# Altium footprint library ECE453.PcbLib: 68 footprints (part 3 of 5)
Each footprint in its own frame and in the unit in brackets; x right, y up, seen from the top. Pads: shape width x height; smd on the part's side, far side on the other; paste and mask are expansions set on the pad; w line width, h text height; cw(c..) or ccw(c..) is an arc to the next point about the centre after c.
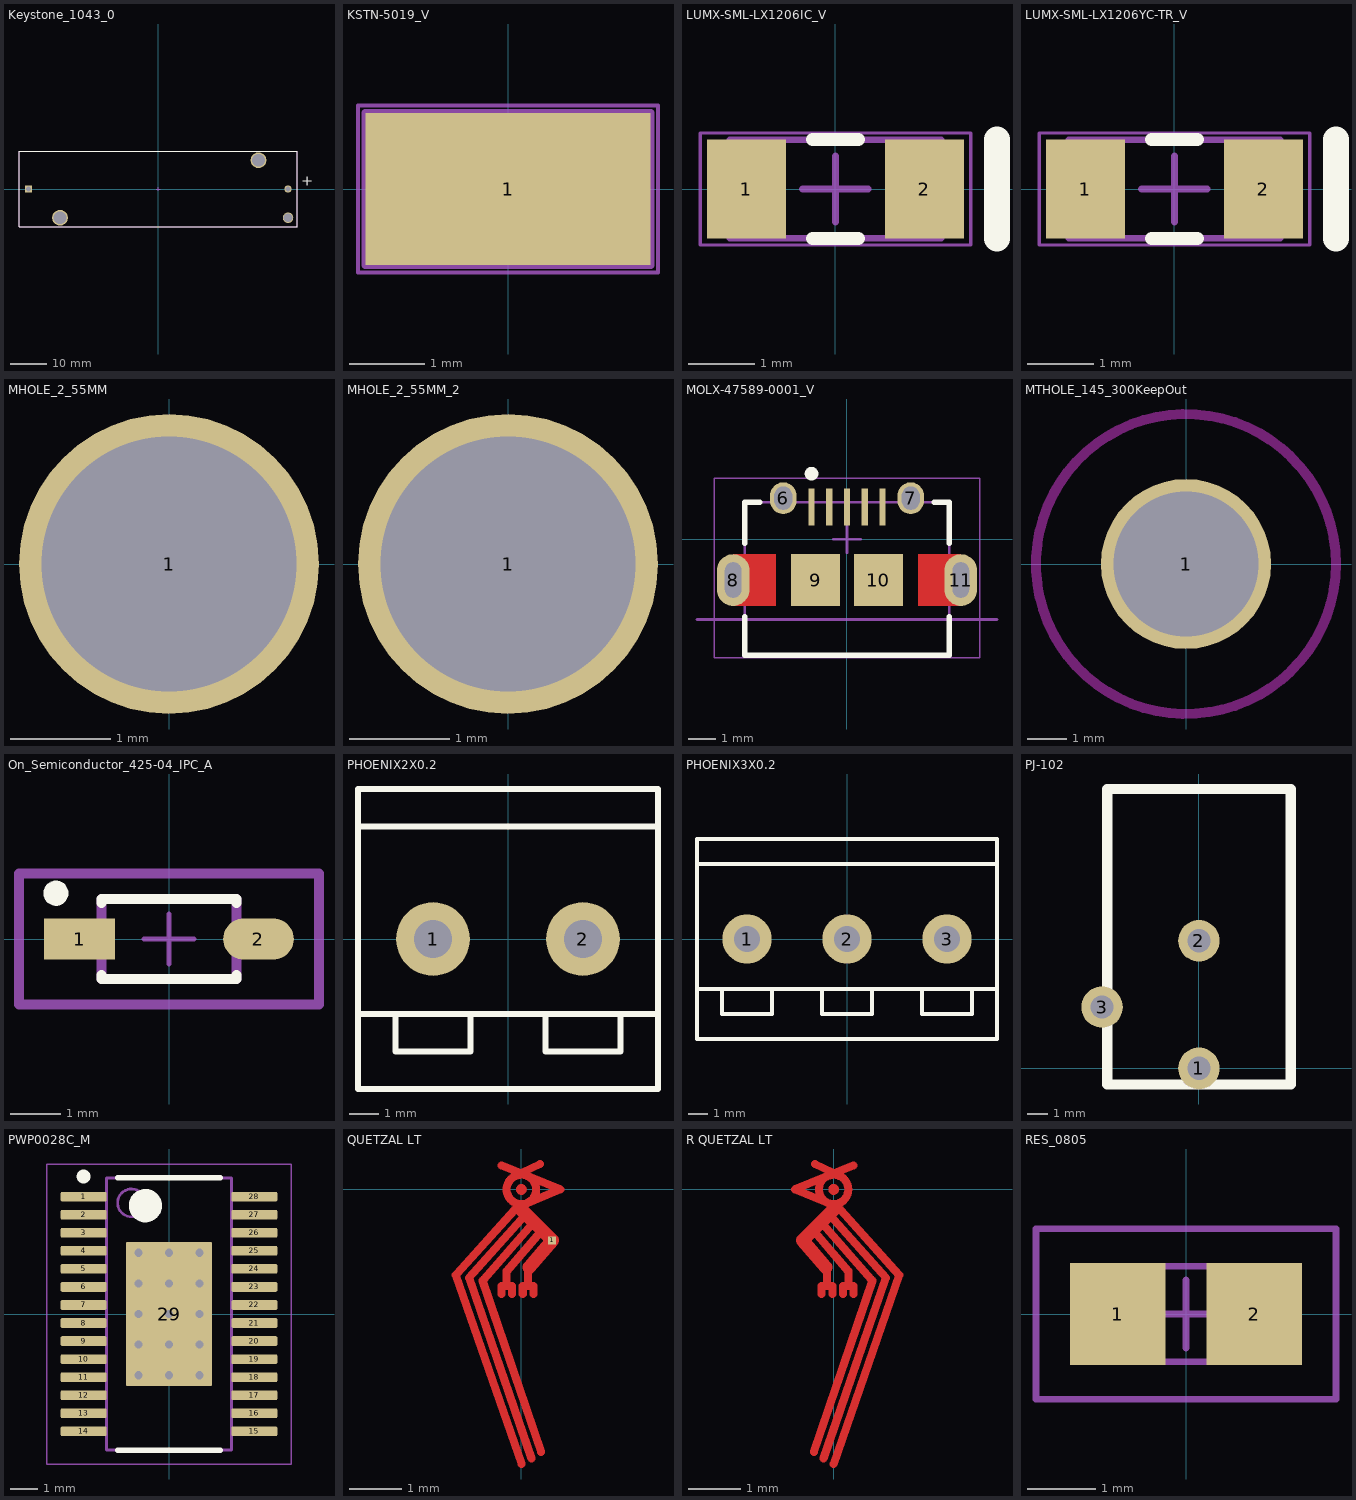
[diagram p2: the footprints below, top view; thin cyan lines are the x and y axes]

## Keystone_1043_0 [mil]
pads (5):
  rect 79.53x79.53 hole 52 paste-39370.1 mask+0: 1(-1422.5,0)
  round 79.53 hole 52 paste-39370.1 mask+0: 2(1422.5,0)
  round 175 hole 140 unplated paste-39370.1 mask+0: ""(-1076.5,-315) ""(1098.5,315)
  round 115 hole 94 unplated paste-39370.1 mask+0: ""(1422.5,-315)
Top Overlay:
  lines w7.87: -1522,-411.5 -1522,411.5 1522,411.5 1522,-411.5 -1522,-411.5
  text "+" at 1564.96,0 h196.85
Mechanical 10:
  lines w7.87: -1525.94,-415.44 -1525.94,415.44 1525.94,415.44 1525.94,-415.44 -1525.94,-415.44
  text ".Designator" at 0,0 h39.37
Mechanical 12:
  lines w5.91: -1522,-411.5 -1522,411.5 1522,411.5 1522,-411.5 -1522,-411.5
Mechanical 15:
  lines w3.94: -19.68,0 19.68,0 ; 0,-19.68 0,19.68
  lines w7.87: -1525.94,-415.44 -1525.94,415.44 1525.94,415.44 1525.94,-415.44 -1525.94,-415.44
3D body "Batt_Keystone_1043_eec.STEP": height 10, standoff 0, extent -1525.94,-415.44 1525.94,415.44

## KSTN-5019_V [mm]
pads (1):
  rect 3.8x2.03 smd: 1(0,0)
Mechanical 13:
  lines w0.1: -1.905,-1.015 1.905,-1.015 1.905,1.015 -1.905,1.015 -1.905,-1.015
Mechanical 15:
  lines w0.05: -2,-1.115 -2,1.115 2,1.115 2,-1.115 -2,-1.115
  lines w0.1: -0.5,0 0.5,0 ; 0,-0.5 0,0.5
3D body "keystone-PN5019.STEP": height 2.29, standoff 0, extent -1.905,-1.015 1.905,1.017

## LUMX-SML-LX1206IC_V [mm]
pads (2):
  rect 1.2x1.5 smd: 1(-1.35,0) 2(1.35,0)
Top Overlay:
  lines w0.2: -0.35,-0.75 0.35,-0.75 ; -0.35,0.75 0.35,0.75
  lines w0.4: 2.45,-0.75 2.45,0.75
Mechanical 13:
  lines w0.1: -1.6,-0.75 1.6,-0.75 1.6,0.75 -1.6,0.75 -1.6,-0.75
Mechanical 15:
  lines w0.05: -2.05,-0.85 2.05,-0.85 2.05,0.85 -2.05,0.85 -2.05,-0.85
  lines w0.1: -0.5,0 0.5,0 ; 0,-0.5 0,0.5
3D body: height 1.1, standoff 0, extent -1.6,-0.8 1.6,0.8

## LUMX-SML-LX1206YC-TR_V [mm]
pads (2):
  rect 1.2x1.5 smd: 1(-1.35,0) 2(1.35,0)
Top Overlay:
  lines w0.2: -0.35,-0.75 0.35,-0.75 ; -0.35,0.75 0.35,0.75
  lines w0.4: 2.45,-0.75 2.45,0.75
Mechanical 13:
  lines w0.1: -1.6,-0.75 -1.6,0.75 1.6,0.75 1.6,-0.75 -1.6,-0.75
Mechanical 15:
  lines w0.05: -2.05,-0.85 2.05,-0.85 2.05,0.85 -2.05,0.85 -2.05,-0.85
  lines w0.1: -0.5,0 0.5,0 ; 0,-0.5 0,0.5
3D body: height 1.25, standoff 0, extent -1.6,-0.75 1.6,0.75

## MHOLE_2_55MM [mm]
pads (1):
  round 3 / inner round 4.572 / far side round 4.318 hole 2.55: 1(0,0)

## MHOLE_2_55MM_2 [mm]
pads (1):
  round 3 / inner round 4.572 / far side round 4.318 hole 2.55: 1(0,0)

## MOLX-47589-0001_V [mm]
pads (11):
  rect 0.222x1.35 smd: 1(-1.3,1.175) 2(-0.65,1.175) 3(0,1.175) 4(0.65,1.175) 5(1.3,1.175)
  oval 0.965x1.168 hole 0.65 slot 0.85 at 90 deg: 6(-2.337,1.5) 7(2.337,1.5)
  oval 1.2x1.9 hole 0.6 slot 1.3 at 90 deg: 8(-4.175,-1.5) 11(4.175,-1.5)
  rect 1.8x1.9 smd: 9(-1.15,-1.5) 10(1.15,-1.5)
Top Layer:
  rectangle: 2.6,-2.45 4.175,-0.55
  region: -2.6,-0.55 -4.175,-0.55 -4.175,-2.45 -2.6,-2.45
Top Overlay:
  circle w0.25: c-1.3,2.4 r0.125
  lines w0.2: -3.75,-2.85 -3.75,-4.25 3.75,-4.25 3.75,-2.85 ; -3.75,-0.15 -3.75,1.35 -3.2,1.35 ; 3.2,1.35 3.75,1.35 3.75,-0.15
Mechanical 1:
  lines w0.1: -5.5,-2.95 5.5,-2.95
  text "PCB EDGE" at 5.7,-2.5 h0.89
Mechanical 13:
  lines w0.1: -3.75,-4.25 3.75,-4.25 3.75,1.35 -3.75,1.35 -3.75,-4.25
Mechanical 15:
  lines w0.05: -4.875,-4.35 -4.875,2.225 4.875,2.225 4.875,-4.35 -4.875,-4.35
  lines w0.1: -0.5,0 0.5,0 ; 0,-0.5 0,0.5
3D body "475890001.stp": height 2.74, standoff -0.57, extent -4.325,-4.25 4.325,1.644

## MTHOLE_145_300KeepOut [mil]
pads (1):
  round 170 / inner round 180 / far side round 170 hole 145: 1(0,0)
Keep-Out Layer:
  circle w10: c0,0 r150

## On_Semiconductor_425-04_IPC_A [mm]
pads (2):
  rect 1.408x0.822 smd paste+0 mask+0: 1(-1.78,0)
  rrect100% 1.408x0.822 smd paste+0 mask+0: 2(1.78,0)
Top Overlay:
  circle w0.25: c-2.249,0.911 r0.125
  lines w0.2: -1.345,-0.72 -1.345,-0.8 1.345,-0.8 1.345,-0.72 ; -1.345,0.72 -1.345,0.8 1.345,0.8 1.345,0.72
Mechanical 10:
  lines w0.2: -2.984,-1.3 -2.984,1.3 2.984,1.3 2.984,-1.3 -2.984,-1.3
Mechanical 12:
  lines w0.2: -1.345,-0.8 -1.345,0.8 1.345,0.8 1.345,-0.8 -1.345,-0.8
Mechanical 15:
  lines w0.1: -0.5,0 0.5,0 ; 0,-0.5 0,0.5
  lines w0.2: -2.984,-1.3 -2.984,1.3 2.984,1.3 2.984,-1.3 -2.984,-1.3
3D body "Diode_On_Semiconductor_MBR0540T1G_eec.STEP": height 0.25, standoff 0, extent -2.984,-1.3 2.984,1.3

## PHOENIX2X0.2 [mm]
pads (2):
  round 2.5 hole 1.295: 1(-2.54,0) 2(2.54,0)
Top Overlay:
  lines w0.203: -5.08,-2.54 5.08,-2.54 ; -5.08,3.81 5.08,3.81 ; -3.81,-2.54 -3.81,-3.81 -1.27,-3.81 -1.27,-2.54 ; 1.27,-2.54 1.27,-3.81 3.81,-3.81 3.81,-2.54 ; 5.08,-2.54 5.08,5.08 -5.08,5.08 -5.08,-5.08 5.08,-5.08 5.08,-2.54
3D body "CUI_DEVICES_TB010-508-P02GR.step": height 18.05, standoff -3.65, extent -5.48,-5.585 5.48,5.715

## PHOENIX3X0.2 [mm]
pads (3):
  round 2.5 hole 1.3: 1(-5.08,0) 2(0,0) 3(5.08,0)
Top Overlay:
  lines w0.203: -7.62,-2.54 7.62,-2.54 ; -7.62,3.81 7.62,3.81 ; -6.35,-2.54 -6.35,-3.81 -3.81,-3.81 -3.81,-2.54 ; -1.27,-2.54 -1.27,-3.81 1.27,-3.81 1.27,-2.54 ; 3.81,-2.54 3.81,-3.81 6.35,-3.81 6.35,-2.54 ; -7.62,-5.08 -7.62,5.08 7.62,5.08 7.62,-1.905 7.62,-5.08 -7.62,-5.08
3D body "CUI_DEVICES_TB010-508-P03GR.step": height 18.05, standoff -3.65, extent -7.995,-5.639 8.045,5.661

## PJ-102 [mil]
pads (3):
  round 80 hole 45: 1(0,0) 2(0,246.05) 3(-187,118.1)
Top Overlay:
  lines w19.68: -177,-31.5 177,-31.5 177,538.87 -177,538.87 -177,-31.5
3D body "pj-102ah.stp": height 435.17, standoff -135.7, extent -190.04,-20 180.04,546.92

## PWP0028C_M [mm]
pads (29):
  rrect29% 1.65x0.35 smd: 1(-3.075,4.225) 2(-3.075,3.575) 3(-3.075,2.925) 4(-3.075,2.275) 5(-3.075,1.625) 6(-3.075,0.975) 7(-3.075,0.325) 8(-3.075,-0.325) 9(-3.075,-0.975) 10(-3.075,-1.625) 11(-3.075,-2.275) 12(-3.075,-2.925) 13(-3.075,-3.575) 14(-3.075,-4.225) 15(3.075,-4.225) 16(3.075,-3.575) 17(3.075,-2.925) 18(3.075,-2.275) 19(3.075,-1.625) 20(3.075,-0.975) 21(3.075,-0.325) 22(3.075,0.325) 23(3.075,0.975) 24(3.075,1.625) 25(3.075,2.275) 26(3.075,2.925) 27(3.075,3.575) 28(3.075,4.225)
  rrect3% 3.1x5.18 smd: 29(0,0)
via -1.1,2.2 diameter 0.6 hole 0.3
via 0,2.2 diameter 0.6 hole 0.3
via 1.1,2.2 diameter 0.6 hole 0.3
via -1.1,1.1 diameter 0.6 hole 0.3
via 0,1.1 diameter 0.6 hole 0.3
via 1.1,1.1 diameter 0.6 hole 0.3
via -1.1,0 diameter 0.6 hole 0.3
via 0,0 diameter 0.6 hole 0.3
via 1.1,0 diameter 0.6 hole 0.3
via -1.1,-1.1 diameter 0.6 hole 0.3
via 0,-1.1 diameter 0.6 hole 0.3
via 1.1,-1.1 diameter 0.6 hole 0.3
via -1.1,-2.2 diameter 0.6 hole 0.3
via 0,-2.2 diameter 0.6 hole 0.3
via 1.1,-2.2 diameter 0.6 hole 0.3
Top Overlay:
  circle w0.25: c-3.075,4.95 r0.125
  circle w0.6: c-0.85,3.9 r0.3
  lines w0.2: -1.85,-4.9 1.85,-4.9 ; -1.85,4.9 1.85,4.9
Mechanical 1:
  text ".Designator" at -1.524,-0.508 h1.02
Mechanical 13:
  circle w0.1: c-1.35,4 r0.5
  lines w0.1: -2.25,-4.9 -2.25,4.9 2.25,4.9 2.25,-4.9 -2.25,-4.9
Mechanical 15:
  lines w0.05: -4.4,-5.4 -4.4,5.4 4.4,5.4 4.4,-5.4 -4.4,-5.4
  lines w0.1: -0.5,0 0.5,0 ; 0,-0.5 0,0.5
3D body: height 1.2, standoff 0.05, extent -2.25,-4.9 2.25,4.9

## QUETZAL LT [mil]
pads (1):
  rect 6x6 smd mask+0: 1(23,-38)
Top Layer:
  circle w4: c0,0 r2
  circle w6: c0,0 r11
  lines w6: -49,-64 0.17,-204.94 ; -48,-63 -5,-15 ; -29,-68 14.74,-196.09 ; -28,-67 8,-26 ; -15,-78 -15,-72 -7,-72 -7,-78 ; -15,18 29,0 0,-12 ; -11,-71 -11,-62 ; -11,-61 14,-32 ; -5,10 14,19 ; 1,-78 1,-72 9,-72 9,-78 ; 3,-19 -39,-66 7.55,-200.84 ; 5,-71 5,-62
  lines w10: 0,-15 23,-38 6,-58
Top Solder:
  circle w6: c0,0 r11
  circle w4: c0,0 r2
  lines w6: -29,-68 14.63,-195.78 ; -28,-67 8,-26 ; -15,-78 -15,-72 -7,-72 -7,-78 ; -15,18 29,0 0,-12 ; -11,-70 -11,-61 14,-32 ; -5,10 14,19 ; -2.83,-12.46 -49,-64 0.17,-204.94 ; 1,-78 1,-72 9,-72 9,-78 ; 3,-19 -39,-66 7.54,-200.81 ; 5,-70 5,-61
  lines w10: 0,-15 23,-38 6,-58

## R QUETZAL LT [mm]
Top Layer:
  circle w0.102: c0,0 r0.051
  circle w0.152: c0,0 r0.279
  lines w0.152: -0.374,-4.981 0.737,-1.727 ; -0.356,-0.813 0.279,-1.549 ; -0.356,0.483 0.127,0.254 ; -0.229,-1.981 -0.229,-1.829 -0.025,-1.829 -0.025,-1.981 ; -0.203,-0.66 0.711,-1.702 ; -0.192,-5.101 0.991,-1.676 -0.076,-0.483 ; -0.127,-1.791 -0.127,-1.562 ; 0,-5.207 1.245,-1.626 0.127,-0.381 ; 0,-0.305 -0.737,0 0.381,0.457 ; 0.178,-1.981 0.178,-1.829 0.381,-1.829 0.381,-1.981 ; 0.279,-1.791 0.279,-1.562
  lines w0.254: -0.152,-1.473 -0.584,-0.965 0,-0.381
Top Solder:
  circle w0.152: c0,0 r0.279
  circle w0.102: c0,0 r0.051
  lines w0.152: -0.372,-4.973 0.737,-1.727 ; -0.356,-0.813 0.279,-1.549 0.279,-1.778 ; -0.356,0.483 0.127,0.254 ; -0.229,-1.981 -0.229,-1.829 -0.025,-1.829 -0.025,-1.981 ; -0.203,-0.66 0.711,-1.702 ; -0.192,-5.101 0.991,-1.676 -0.076,-0.483 ; -0.127,-1.765 -0.127,-1.537 ; 0,-5.207 1.245,-1.626 0.076,-0.33 ; 0,-0.305 -0.737,0 0.381,0.457 ; 0.178,-1.981 0.178,-1.829 0.381,-1.829 0.381,-1.981
  lines w0.254: -0.152,-1.473 -0.584,-0.965 0,-0.381

## RES_0805 [mm]
pads (2):
  rect 1.4x1.5 smd: 1(-1,0) 2(1,0)
Mechanical 13:
  lines w0.1: -1.075,-0.7 -1.075,0.7 1.075,0.7 1.075,-0.7 -1.075,-0.7
Mechanical 15:
  lines w0.1: -0.5,0 0.5,0 ; 0,-0.5 0,0.5 ; -2.2,-1.25 -2.2,1.25 2.2,1.25 2.2,-1.25 -2.2,-1.25
3D body: height 0.7, standoff 0, extent -1.075,-0.7 1.075,0.7